# Altium footprint library General.PcbLib: 446 footprints (part 3 of 28)
Each footprint in its own frame and in the unit in brackets; x right, y up, seen from the top. Pads: shape width x height; smd on the part's side, far side on the other; paste and mask are expansions set on the pad; w line width, h text height; cw(c..) or ccw(c..) is an arc to the next point about the centre after c.
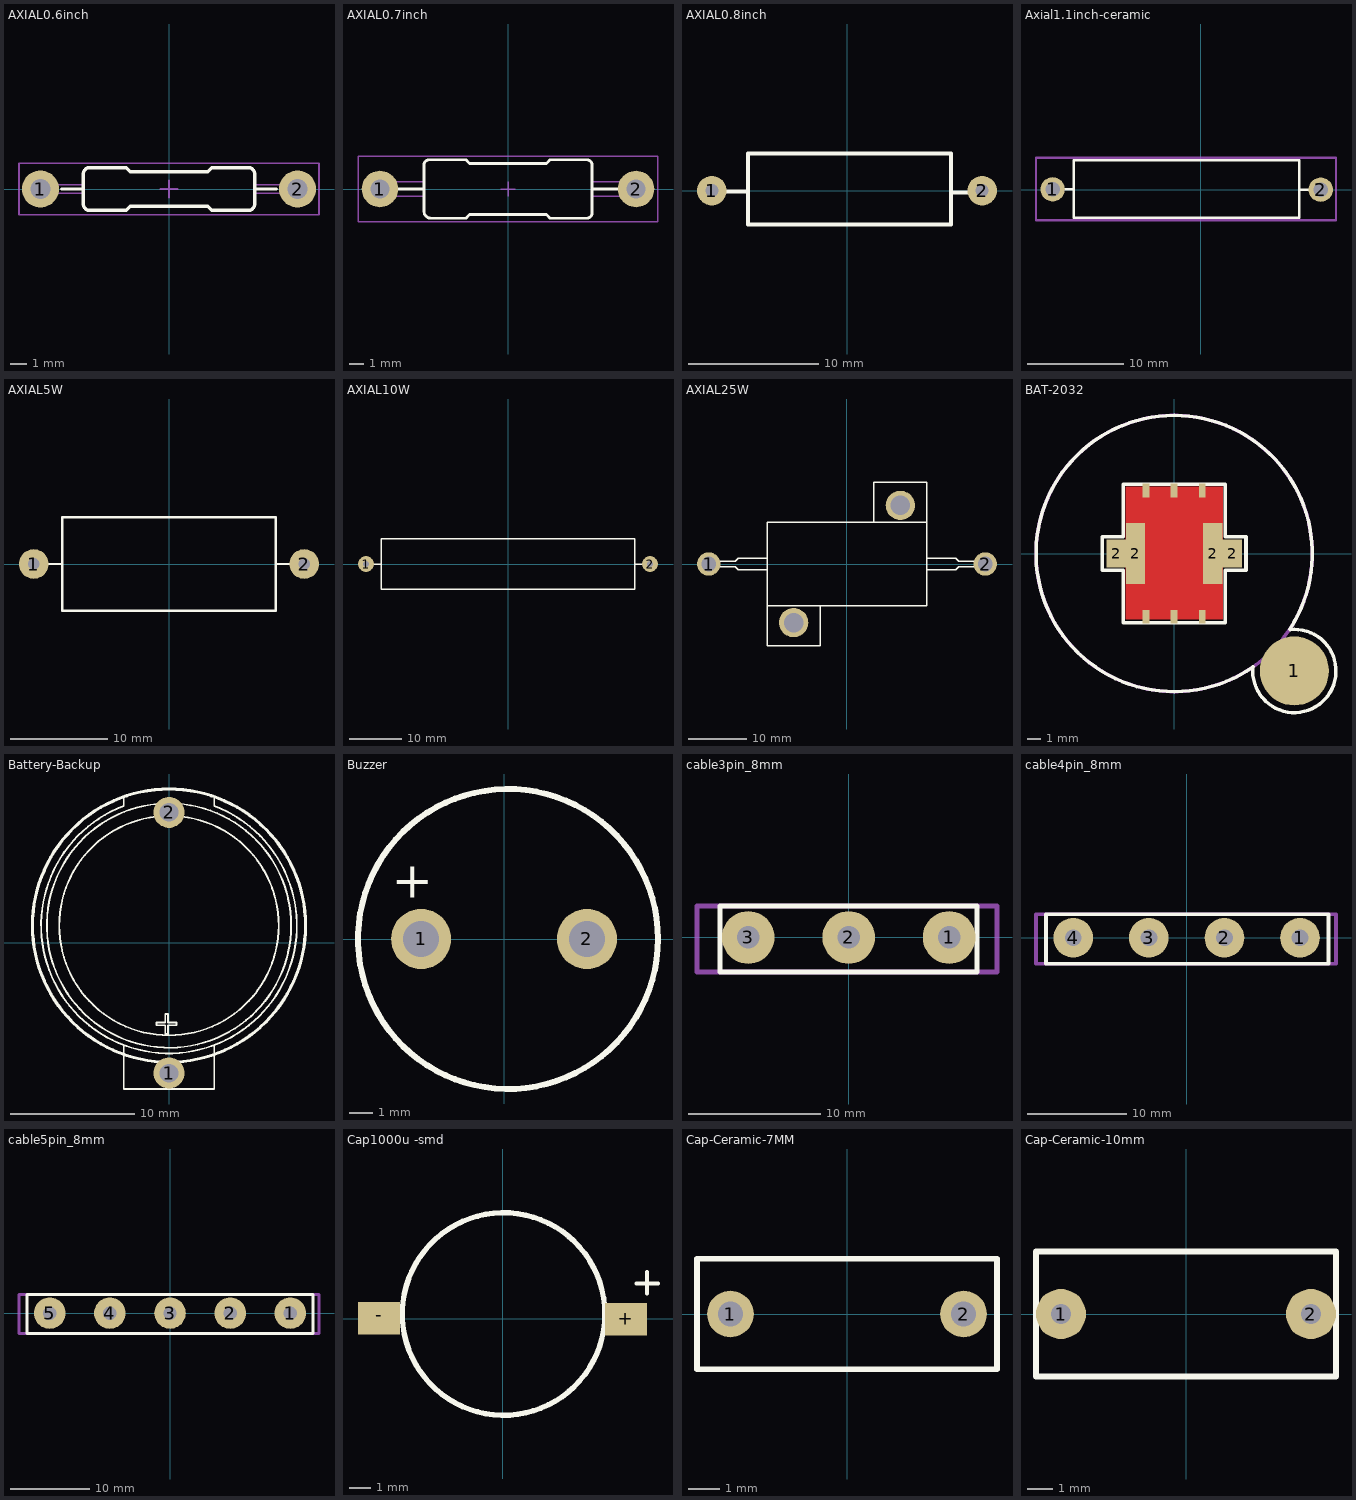
[diagram p2: the footprints below, top view; thin cyan lines are the x and y axes]

## AXIAL0.6inch [mm] "Resistor, Axial; Body 10.16 x 2.54mm ,Pitch 15.24mm"
height 2.54
pads (2):
  round 2.2 hole 1.2: 1(-7.62,0) 2(7.62,0)
Top Overlay:
  lines w0.2: -6.35,0 -5.08,0 ; 4.572,-1.27 4.699,-1.27 ; 5.08,0 6.35,0 ; 4.699,-1.27 ccw(c4.699,-0.889) 5.08,-0.889 5.08,0.889 ccw(c4.699,0.889) 4.699,1.27 2.54,1.27 2.286,1.016 -2.286,1.016 -2.54,1.27 -4.699,1.27 ccw(c-4.699,0.889) -5.08,0.889 -5.08,-0.889 ccw(c-4.699,-0.889) -4.699,-1.27 -2.54,-1.27 -2.286,-1.016 2.286,-1.016 2.54,-1.27 4.699,-1.27
Mechanical 13:
  lines w0.1: -7.366,-0.254 -7.366,0.254 ; -5.08,-0.254 -7.62,-0.254 cw(c-7.62,-0.127) -7.747,-0.127 -7.747,0.127 cw(c-7.62,0.127) -7.62,0.254 -5.08,0.254 ; 4.572,-1.27 4.699,-1.27 ; 5.08,-0.254 7.62,-0.254 ccw(c7.62,-0.127) 7.747,-0.127 7.747,0.127 ccw(c7.62,0.127) 7.62,0.254 5.08,0.254 ; 7.366,-0.254 7.366,0.254 ; 4.699,-1.27 ccw(c4.699,-0.889) 5.08,-0.889 5.08,0.889 ccw(c4.699,0.889) 4.699,1.27 2.54,1.27 2.286,1.016 -2.286,1.016 -2.54,1.27 -4.699,1.27 ccw(c-4.699,0.889) -5.08,0.889 -5.08,-0.889 ccw(c-4.699,-0.889) -4.699,-1.27 -2.54,-1.27 -2.286,-1.016 2.286,-1.016 2.54,-1.27 4.699,-1.27
Mechanical 15:
  lines w0.1: -0.508,0 0,0 ; 0,-0.508 0,0 ; 0,0.508 0,0 ; 0.508,0 0,0 ; -8.89,-1.524 8.89,-1.524 8.89,1.524 -8.89,1.524 -8.89,-1.524
3D body "SW3dPS-5083NW20K00J12AFX-2.STEP": height 3.66, standoff -2.53, extent -8.103,-1.753 7.937,1.747

## AXIAL0.7inch [mm] "Resistor, Axial; Body 11.7x 4.1mm ,Pitch 17.78mm"
height 4.064
pads (2):
  round 2.54 hole 1.3: 1(-8.89,0) 2(8.89,0)
Top Overlay:
  lines w0.2: -7.62,0 -5.842,0 ; 5.842,0 7.62,0 ; 5.842,1.524 5.842,1.651 ; 5.842,1.651 ccw(c5.461,1.651) 5.461,2.032 2.921,2.032 2.667,1.778 -2.667,1.778 -2.921,2.032 -5.334,2.032 -5.461,2.032 ccw(c-5.461,1.651) -5.842,1.651 -5.842,-1.524 ccw(c-5.334,-1.524) -5.334,-2.032 -2.921,-2.032 -2.667,-1.778 2.667,-1.778 2.921,-2.032 5.461,-2.032 ccw(c5.461,-1.651) 5.842,-1.651 5.842,1.651
Mechanical 13:
  lines w0.1: -8.636,-0.508 -8.636,0.508 ; -5.842,-0.508 -9.017,-0.508 cw(c-9.017,-0.381) -9.144,-0.381 -9.144,0.381 cw(c-9.017,0.381) -9.017,0.508 -5.842,0.508 ; 5.842,-0.508 9.017,-0.508 ccw(c9.017,-0.381) 9.144,-0.381 9.144,0.381 ccw(c9.017,0.381) 9.017,0.508 5.842,0.508 ; 5.842,1.524 5.842,1.651 ; 8.636,-0.508 8.636,0.508 ; 5.842,1.651 ccw(c5.461,1.651) 5.461,2.032 2.921,2.032 2.667,1.778 -2.667,1.778 -2.921,2.032 -5.334,2.032 -5.461,2.032 ccw(c-5.461,1.651) -5.842,1.651 -5.842,-1.524 ccw(c-5.334,-1.524) -5.334,-2.032 -2.921,-2.032 -2.667,-1.778 2.667,-1.778 2.921,-2.032 5.461,-2.032 ccw(c5.461,-1.651) 5.842,-1.651 5.842,1.651
Mechanical 15:
  lines w0.1: -0.508,0 0,0 ; 0,-0.508 0,0 ; 0,0.508 0,0 ; 0.508,0 0,0 ; -10.414,-2.286 -10.414,2.286 10.414,2.286 10.414,-2.286 -10.414,-2.286
3D body "Res70 2W SilCoat.step": height 5.77, standoff -1.5, extent -9.295,-2.766 9.295,2.715

## AXIAL0.8inch [mil]
pads (2):
  round 90 hole 39.37: 1(-410,0) 2(410,0)
Top Overlay:
  lines w12: -371,-3 -301,-3 ; 318,-5 388,-5 ; -300,-102 315,-102 315,112 -300,112 -300,-102
3D body "RES-2W.STEP": height 0, standoff -334.65, extent -412.78,-100 414.78,116.54

## Axial1.1inch-ceramic [mm] "res 5W"
pads (2):
  round 2.54 hole 1.5: 1(-15.412,0.025) 2(12.5,0)
Top Overlay:
  lines w0.254: -15.412,0.025 -13.208,0.025 ; 10.287,0 12.5,0 ; -13.208,-2.921 -13.208,3.048 10.287,3.048 10.287,-2.921 -13.208,-2.921
Mechanical 15:
  lines w0.254: -17.145,-3.175 14.097,-3.175 14.097,3.302 -17.145,3.302 -17.145,-3.175
3D body "RES-5W-High.STEP": height 10.01, standoff -7, extent -15.811,-2.975 12.929,3.025

## AXIAL5W [mil]
pads (2):
  round 120 hole 47.24: 1(-550,0) 2(550,0)
Top Overlay:
  lines w10: -490,0 -435,0 ; 435,0 490,0 ; -435,-190 -435,190 435,190 435,-190 -435,-190

## AXIAL10W [mil]
pads (2):
  round 120 hole 47.24: 1(-1065,0) 2(1065,0)
Top Overlay:
  lines w10: -1005,0 -950,0 ; 950,0 1005,0 ; -950,-190 -950,190 950,190 950,-190 -950,-190

## AXIAL25W [mm]
pads (4):
  round 4 hole 2.5: 1(-23.6,0) 2(23.6,0)
  round 5 hole 3.3: ""(-9.1,-10) ""(9.1,10)
Top Overlay:
  circle w0.254: c-9.1,-10 r1.65
  circle w0.254: c9.1,10 r1.65
  lines w0.254: -13.6,-1 -18.6,-1 -19.1,-0.5 -23.6,-0.5 -23.6,0 -23.6,0.5 -19.1,0.5 -18.6,1 -13.6,1 ; 13.6,-1 18.6,-1 19.1,-0.5 23.6,-0.5 23.6,0 23.6,0.5 19.1,0.5 18.6,1 13.6,1 ; -13.6,-7.15 13.6,-7.15 13.6,7.15 ; -13.6,-7.15 -13.6,7.15 13.6,7.15 ; -13.6,-7.15 -13.6,-13.95 -4.6,-13.95 -4.6,-7.15 -13.6,-7.15 ; 13.6,7.15 13.6,13.95 4.6,13.95 4.6,7.15 13.6,7.15

## BAT-2032 [mm]
pads (11):
  round 5 smd: 1(8.701,-8.5)
  rect 1.4x2 smd: 2(-4.199,0) 2(4.201,0)
  rect 1.4x4.4 smd: 2(-2.799,0) 2(2.801,0)
  rect 0.5x1 smd: 2(-2.032,-4.572) 2(-2.032,4.572) 2(0,-4.572) 2(0,4.572) 2(2.032,-4.572) 2(2.032,4.572)
Top Layer:
  pour cut-out: -3.495,4.825 3.505,4.825 3.505,-4.775 -3.495,-4.775
Top Overlay:
  lines w0.254: 5.7,-8.21 ccw(c8.701,-8.5) 8.391,-5.501 ; 5.714,-8.206 cw(c0,0) 8.373,-5.467 ; -5.199,-1.2 -5.199,1.2 -3.699,1.2 -3.699,5 3.701,5 3.701,1.2 5.201,1.2 5.201,-1.2 3.701,-1.2 3.701,-5 -3.699,-5 -3.699,-1.2 -5.199,-1.2
Mechanical 15:
  circle w0.254: c0.001,0 r10

## Battery-Backup [mm]
height 5
pads (2):
  round 2.5 hole 1.5: 1(0,-10.503) 2(0,10.503)
Top Overlay:
  circle w0.254: c0,1.384 r11
  circle w0.15: c-0.002,1.386 r8.844
  circle w0.15: c-0.002,1.386 r9.844
  lines w0.15: -3.652,-8.991 cw(c-0.002,1.386) 3.648,-8.991 ; -3.652,-8.247 -3.652,-11.784 3.648,-11.784 3.648,-8.247 ; -3.652,11.762 -3.652,11.019 ccw(c-0.002,1.386) 3.648,11.019 3.648,11.762 ; -1.008,-6.646 -0.306,-6.646 -0.306,-7.349 -0.092,-7.349 -0.092,-6.646 0.61,-6.646 0.61,-6.433 -0.092,-6.433 -0.092,-5.731 -0.306,-5.731 -0.306,-6.433 -1.008,-6.433 -1.008,-6.646
3D body "Backup Battery.STEP": height 8.49, standoff 0.02, extent -11.02,-11.807 10.963,12.363

## Buzzer [mm]
height 10
pads (2):
  round 2.54 hole 1.524: 1(-3.5,0) 2(3.5,0)
Top Overlay:
  circle w0.254: c0.167,0 r6.334
  text "+" at -2.992,3.048 h1.52
3D body "SW3dPS-WST-1203UX.STEP": height 9.66, standoff -4.49, extent -9.331,-5.969 6.114,6.031

## cable3pin_8mm [mm]
pads (3):
  round 4 hole 1.7: 1(7.62,0) 2(0,0) 3(-7.62,0)
Top Overlay:
  lines w0.381: -9.75,-2.62 -9.75,2.38 9.75,2.38 9.75,-2.62 -9.75,-2.62
Mechanical 15:
  lines w0.381: -11.5,-2.62 -11.5,2.38 11.25,2.38 11.25,-2.62 -11.5,-2.62

## cable4pin_8mm [mm]
pads (4):
  round 4 hole 1.7: 1(11.43,0) 2(3.81,0) 3(-3.81,0) 4(-11.43,0)
Top Overlay:
  lines w0.381: -14.19,-2.62 14.31,-2.62 14.31,2.38 -14.19,2.38 -14.19,-2.62
Mechanical 15:
  lines w0.381: -15.19,-2.62 15.06,-2.62 15.06,2.38 -15.19,2.38 -15.19,-2.62

## cable5pin_8mm [mm]
pads (5):
  round 4 hole 1.7: 1(15.24,0) 2(7.62,0) 3(0,0) 4(-7.62,0) 5(-15.24,0)
Top Overlay:
  lines w0.381: -18.13,-2.62 -18.13,2.38 18.12,2.38 18.12,-2.62 -18.13,-2.62
Mechanical 15:
  lines w0.381: -19.13,-2.62 -19.13,2.38 18.87,2.38 18.87,-2.62 -19.13,-2.62

## Cap1000u -smd [mm]
pads (2):
  rect 2x1.524 smd: +(5.85,-0.025) -(-5.85,0.025)
Top Overlay:
  circle w0.254: c0.05,0.225 r4.8
  lines w0.2: 6.351,1.675 7.367,1.675 ; 6.848,1.202 6.848,2.218
3D body "SW3dPS-capacitor size G.STEP": height 10.21, standoff -0.01, extent -5.65,-5.075 5.95,5.225

## Cap-Ceramic-7MM [mm] "400V 1NF"
pads (2):
  round 1.5 hole 0.8: 1(-3.75,0) 2(3.75,0)
Top Overlay:
  lines w0.178: -4.826,-1.778 4.826,-1.778 4.826,1.778 -4.826,1.778 -4.826,-1.778
3D body "CAP750 8_9x7x3_6.STEP": height 8, standoff -9, extent -4.383,-1.768 4.417,1.833

## Cap-Ceramic-10mm [mm] "400V 1NF"
pads (2):
  round 2 hole 0.8: 1(-5,0) 2(5,0)
Top Overlay:
  lines w0.254: -6,-2.5 -6,2.5 6,2.5 6,-2.5 -6,-2.5
3D body "cap10mm.STEP": height 9.5, standoff -2, extent -5.721,-2.311 5.779,2.309